# Altium footprint library ICL_passives_v1.PcbLib: 102 footprints (part 6 of 7)
Each footprint in its own frame and in the unit in brackets; x right, y up, seen from the top. Pads: shape width x height; smd on the part's side, far side on the other; paste and mask are expansions set on the pad; w line width, h text height; cw(c..) or ccw(c..) is an arc to the next point about the centre after c.
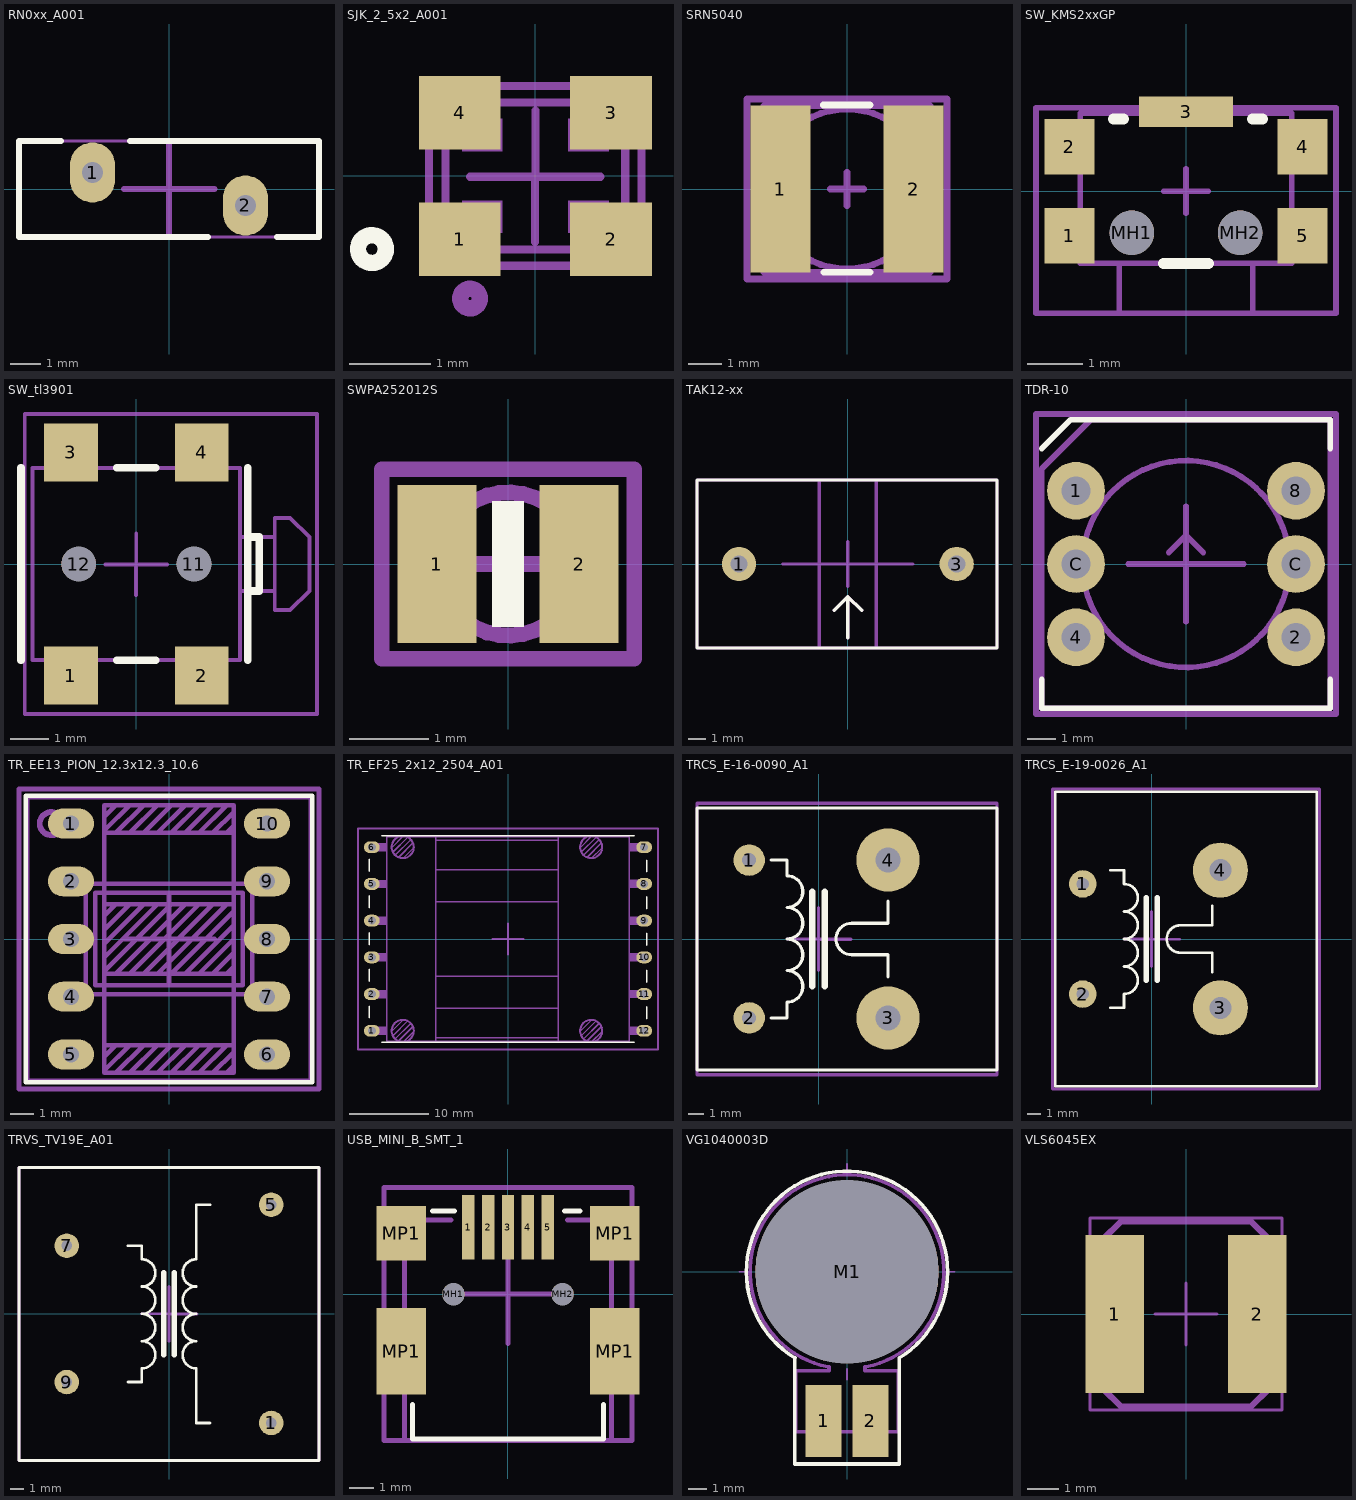
[diagram p5: the footprints below, top view; thin cyan lines are the x and y axes]

## RN0xx_A001 [mm] "fi 10mm L 14mm e 5.1mm"
pads (2):
  oval 1.5x2 hole 0.7 mask+0.1: 1(-2.55,0.55) 2(2.55,-0.55)
Top Overlay:
  lines w0.2: -3.6,1.6 -5,1.6 -5,-1.6 1.3,-1.6 ; -1.3,1.6 5,1.6 5,-1.6 3.6,-1.6
Top M17-18_TDES:
  text "'.Designator'" at -6.798,-3.9 h1.2
Top M19-20_TMOT:
  lines w0.1: -5,-1.6 -5,1.6 5,1.6 5,-1.6 -5,-1.6
Top M25-26_TORG:
  lines w0.2: -1.5,0 0,0 ; 0,-1.5 0,0 ; 0,1.5 0,0 ; 0.017,-0.005 1.517,-0.005
3D body "User Library-RXE020.STEP": height 11.79, standoff -2.9, extent -3.7,-1.5 3.7,1.5

## SJK_2_5x2_A001 [mm] "XTAL"
pads (4):
  rect 1x0.9 smd: 1(-0.925,-0.775) 2(0.925,-0.775) 3(0.925,0.775) 4(-0.925,0.775)
Top Overlay:
  circle w0.2: c-2,-0.895 r0.17
Top M11-12_SMOT:
  circle w0.2: c-0.8,-1.5 r0.12
  rectangle: -0.9,-0.7 -0.4,-0.3
  rectangle: 0.4,-0.7 0.9,-0.3
  rectangle: 0.4,0.3 0.9,0.7
  rectangle: -0.9,0.3 -0.4,0.7
  lines w0.1: -1.3,-0.9 cw(c-1.3,-1.1) -1.1,-1.1 1.1,-1.1 cw(c1.3,-1.1) 1.3,-0.9 1.3,0.9 cw(c1.3,1.1) 1.1,1.1 -1.1,1.1 cw(c-1.3,1.1) -1.3,0.9 -1.3,-0.9 ; -1.1,-0.7 ccw(c-0.9,-0.7) -0.9,-0.9 0.9,-0.9 ccw(c0.9,-0.7) 1.1,-0.7 1.1,0.7 ccw(c0.9,0.7) 0.9,0.9 0,0.9 -0.9,0.9 ccw(c-0.9,0.7) -1.1,0.7 -1.1,-0.7
Top M13-14_SDES:
  text "'.Designator'" at -3.399,1.75 h0.6
Top M15-16_SORG:
  lines w0.1: -0.802,-0.009 -0.002,-0.009 ; -0.005,-0.809 -0.005,-0.009 0.795,-0.009 ; 0,0 0,0.8 ; -1.3,-1.1 -1.3,1.1 1.3,1.1 1.3,-1.1 -1.3,-1.1
3D body: height 0.4, standoff 0, extent -1.3,-1.1 1.3,1.1
3D body: height 0.6, standoff 0.4, extent -1.209,-1.014 1.231,1.017

## SRN5040 [mm] "BOURNS  SRN5040"
pads (2):
  rect 1.8x5 smd mask+0: 1(-2,0) 2(2,0)
Top Overlay:
  lines w0.2: -0.71,2.52 0.69,2.52 ; -0.7,-2.5 0.7,-2.5
Top M11-12_SMOT:
  circle w0.2: c0,0 r2.4
  rectangle: 2.5,-2.1 2.8,2.1
  region: -2.506,2.123 -2.8,2.123 -2.8,-2.077 -2.506,-2.077
  lines w0.2: -2.5,-2.5 2.5,-2.5 2.5,2.5 -2.5,2.5 -2.5,-2.5
Top M13-14_SDES:
  text "'.Designator'" at -4.532,-0.333 h0.8
Top M15-16_SORG:
  lines w0.2: -0.5,0 0.5,0 ; 0,-0.5 0,0.5 ; -3,-2.7 -3,2.7 3,2.7 3,-2.7 -3,-2.7
3D body "SRN5040_v3.STEP": height 4.01, standoff 0.01, extent -2.5,-2.5 2.5,2.5

## SW_KMS2xxGP [mm] "smd side SW"
height 0.37
pads (7):
  rect 0.9x1 smd: 1(-2.1,-0.8) 2(-2.1,0.8) 4(2.1,0.8) 5(2.1,-0.8)
  rect 1.7x0.55 smd: 3(0,1.425)
  round 0.8 hole 0.8 unplated: MH1(-0.975,-0.75) MH2(0.975,-0.75)
Top Overlay:
  lines w0.2: -1.3,1.3 -1.125,1.3 ; -0.4,-1.3 0.4,-1.3 ; 1.2,1.3 1.375,1.3
Top M11-12_SMOT:
  region: -1.8,-0.4 -2.4,-0.4 -2.4,-1.2 -1.8,-1.2
  region: -1.8,1.2 -2.4,1.2 -2.4,0.4 -1.8,0.4
  rectangle: 1.8,-1.2 2.4,-0.4
  rectangle: 1.8,0.4 2.4,1.2
  lines w0.1: -1.2,-1.3 -1.2,-2.2 1.2,-2.2 1.2,-1.3 ; -1.9,-1.3 -1.9,1.4 1.9,1.4 1.9,-1.3 -1.9,-1.3
Top M13-14_SDES:
  text "'.Designator'" at -2.266,-0.167 h0.4
Top M15-16_SORG:
  lines w0.1: -0.4,0 0.4,0 ; 0,-0.4 0,0.4 ; -2.7,-2.2 -2.7,1.5 2.7,1.5 2.7,-2.2 -2.7,-2.2
3D body "KMS221GPLFS_col.stp": height 1.43, standoff -0.49, extent -2.3,-2.15 2.3,1.4

## SW_tl3901 [mm] "switch angle SMD"
pads (6):
  rect 1.4x1.5 smd: 1(-1.7,-2.9) 2(1.7,-2.9) 3(-1.7,2.9) 4(1.7,2.9)
  round 0.9 hole 0.9 unplated: 11(1.5,0) 12(-1.5,0)
Top Overlay:
  lines w0.2: -3,-2.5 -3,2.5 ; -0.5,-2.5 0.5,-2.5 ; -0.5,2.5 0.5,2.5 ; 2.9,-2.5 2.9,2.5 ; 2.9,-0.7 3.2,-0.7 3.2,0.7 2.9,0.7
Top M11-12_SMOT:
  rectangle: -2.3,2.2 -1.1,3.6
  rectangle: 1.1,2.2 2.3,3.6
  rectangle: 1.1,-3.6 2.3,-2.2
  rectangle: -2.3,-3.6 -1.1,-2.2
  lines w0.1: 2.7,-0.7 3.6,-0.7 ; 2.7,0.7 3.6,0.7 ; -2.7,-2.5 2.7,-2.5 2.7,2.5 -2.7,2.5 -2.7,-2.5 ; 3.6,-1.2 3.6,1.2 4,1.2 4.5,0.7 4.5,-0.7 4,-1.2 3.6,-1.2
Top M13-14_SDES:
  text "'.Designator'" at -3.399,1.15 h0.6
Top M15-16_SORG:
  lines w0.1: -0.802,-0.009 -0.002,-0.009 ; -0.005,-0.809 -0.005,-0.009 0.795,-0.009 ; 0,0 0,0.8 ; -2.9,-3.9 4.7,-3.9 4.7,3.9 -2.9,3.9 -2.9,-3.9
3D body "tl3901.stp": height 1.91, standoff -0.49, extent -2.7,-3 4.55,3

## SWPA252012S [mm]
pads (2):
  rect 1x2 smd mask+0: 1(-0.9,0) 2(0.9,0)
Top Overlay:
  rectangle: -0.2,-0.8 0.2,0.8
Top M11-12_SMOT:
  circle w0.2: c0,0 r0.906
  lines w0.2: -0.5,-0.8 -0.9,-0.8 -0.9,0.8 -0.5,0.8 ; 0.5,-0.8 0.906,-0.8 0.906,0.8 0.5,0.8
Top M13-14_SDES:
  text "'.Designator'" at -4.532,1.667 h0.8
Top M15-16_SORG:
  lines w0.2: -0.5,0 0.5,0 ; 0,-0.5 0,0.5 ; -1.6,-1.2 -1.6,1.2 1.6,1.2 1.6,-1.2 -1.6,-1.2
3D body "SWPA252012S.stp": height 1.02, standoff 0.01, extent -1.3,-1.1 1.3,1.1

## TAK12-xx [mm]
pads (2):
  round 2 hole 1: 1(-6.35,0) 3(6.35,0)
Top Overlay:
  lines w0.2: -0.8,-2.7 0,-1.9 ; 0,-4.3 0,-1.9 ; 0.8,-2.7 0,-1.9 ; -8.8,-4.9 -8.8,4.9 8.7,4.9 8.7,-4.9 -8.8,-4.9
Top M17-18_TDES:
  text "'.Designator'" at -5.765,2.583 h1
Top M19-20_TMOT:
  lines w0.2: -1.663,-4.9 -1.663,4.9 ; -0.8,-2.7 0,-1.9 ; 0,-4.3 0,-1.9 ; 0.8,-2.7 0,-1.9 ; 1.663,-4.9 1.663,4.9 ; -8.8,-4.9 8.7,-4.9 8.7,4.9 -8.8,4.9 -8.8,-4.9
Top M25-26_TORG:
  lines w0.2: -3.8,0 0,0 ; 0,-1.3 0,0 ; 0,1.3 0,0 ; 3.8,0 0,0
3D body "TAK12_A001.stp": height 21.21, standoff -4.19, extent -8.6,-4.75 8.6,4.75

## TDR-10 [mm] "rotary dip switch"
pads (6):
  round 2 hole 1 paste+0 mask+0.05: 1(-3.81,2.54) 2(3.81,-2.54) 4(-3.81,-2.54) 8(3.81,2.54) C(-3.81,0) C(3.81,0)
Top Overlay:
  lines w0.2: -5,-4 -5,-5 5,-5 5,-4 ; -5,4 -4,5 5,5 5,4
Top M17-18_TDES:
  text "'.Designator'" at 0.417,-5.665 h1
Top M19-20_TMOT:
  circle w0.2: c0,0 r3.585
  lines w0.2: 0,-0.9 0,1 ; 0.6,0.4 0,1 ; -0.6,0.4 -0.6,0.4 ; -0.6,0.4 0,1 ; -5,-5 -5,3.3 -3.3,5 5,5 5,-5 -5,-5
  text "9" at -1.561,1.28 h1.2
  text "8" at -1.953,0.034 h1.2
  text "7" at -1.706,-0.795 h1.2
  text "6" at -0.824,-1.75 h1.2
  text "5" at 0.4,-1.9 h1.2
  text "4" at 1.471,-1.28 h1.2
  text "3" at 1.853,-0.334 h1.2
  text "2" at 1.706,1.095 h1.2
  text "1" at 0.886,1.732 h1.2
  text "0" at 0.3,3.1 h1.2
Top M25-26_TORG:
  lines w0.2: -2,0 0,0 ; 0,-2 0,0 ; 0,2 0,0 ; 2,0 0,0 ; -5.2,-5.2 -5.2,5.2 5.2,5.2 5.2,-5.2 -5.2,-5.2
3D body "TDR-10.STEP": height 6.61, standoff -3.79, extent -5,-5 5,5

## TR_EE13_PION_12.3x12.3_10.6 [mm]
pads (10):
  oval 2x1.3 hole 0.7: 1(-4.25,5) 2(-4.25,2.5) 3(-4.25,0) 4(-4.25,-2.5) 5(-4.25,-5) 6(4.25,-5) 7(4.25,-2.5) 8(4.25,0) 9(4.25,2.5) 10(4.25,5)
Top Overlay:
  lines w0.2: -6.2,-6.2 -6.2,5.8 -6.2,6.2 6.2,6.2 6.2,-6.2 -6.2,-6.2
Top M17-18_TDES:
  text "'.Designator'" at -0.583,7.931 h1.4
Top M19-20_TMOT:
  circle w0.254: c-5.1,5 r0.5
  lines w0.2: -2.8,-5.7 -1.7,-4.6 ; -2.8,-5.1 -2.3,-4.6 ; -2.8,-4.6 2.8,-4.6 ; -2.8,-1.5 2.8,-1.5 ; -2.8,-1.4 0.1,1.5 ; -2.8,-0.8 -0.5,1.5 ; -2.8,-0.2 -1.1,1.5 ; -2.8,0.4 -1.7,1.5 ; -2.8,1 -2.3,1.5 ; -2.8,1.5 2.8,1.5 ; -2.8,4.6 2.8,4.6 ; -2.8,4.7 -1.7,5.8 ; -2.8,5.3 -2.3,5.8 ; -2.3,-5.8 -1.1,-4.6 ; -2.3,-1.5 0.7,1.5 ; -2.3,4.6 -1.1,5.8 ; -1.7,-5.8 -0.5,-4.6 ; -1.7,-1.5 1.3,1.5 ; -1.7,4.6 -0.5,5.8 ; -1.1,-5.8 0.1,-4.6 ; -1.1,-1.5 1.9,1.5 ; -1.1,4.6 0.1,5.8 ; -0.6,-1.5 -0.5,-1.5 2.5,1.5 ; -0.5,-5.8 0.7,-4.6 ; -0.5,4.6 0.7,5.8 ; 0.1,-5.8 1.3,-4.6 ; 0.1,-1.5 2.8,1.2 ; 0.1,4.6 1.3,5.8 ; 0.7,-5.8 1.9,-4.6 ; 0.7,-1.5 2.8,0.6 ; 0.7,4.6 1.9,5.8 ; 1.3,-5.8 2.5,-4.6 ; 1.3,-1.5 2.8,0 ; 1.3,4.6 2.5,5.8 ; 1.9,-5.8 2.8,-4.9 ; 1.9,-1.5 2.8,-0.6 ; 1.9,4.6 2.8,5.5 ; 2.5,-5.8 2.8,-5.5 ; 2.5,-1.5 2.8,-1.2 ; 2.5,4.6 2.8,4.9 ; -6.15,-6.15 -6.15,6.15 6.15,6.15 6.15,-6.15 -6.15,-6.15 ; -3.6,-2.4 -3.6,2.4 3.6,2.4 3.6,-2.4 -3.6,-2.4 ; -3.2,-2 3.2,-2 3.2,2 -3.2,2 -3.2,-2 ; -2.8,-5.8 -2.8,5.8 2.8,5.8 2.8,-5.8 -2.8,-5.8
Top M25-26_TORG:
  lines w0.2: -1.97,0 0,0 ; 0,-1.97 0,0 ; 0,1.97 0,0 ; 1.97,0 0,0 ; -6.5,-6.5 6.5,-6.5 6.5,6.5 -6.5,6.5 -6.5,-6.5
3D body "EE13-K-V-10P-SS_zêo+enie.STEP": height 12.1, standoff -4.75, extent -6.15,-6.5 6.15,6.5

## TR_EF25_2x12_2504_A01 [mm]
pads (12):
  oval 2x1.5 hole 1: 1(-17.25,-11.625) 2(-17.25,-6.975) 3(-17.25,-2.325) 4(-17.25,2.325) 5(-17.25,6.975) 6(-17.25,11.625) 7(17.25,11.625) 8(17.25,6.975) 9(17.25,2.325) 10(17.25,-2.325) 11(17.25,-6.975) 12(17.25,-11.625)
Top Overlay:
  lines w0.2: -17.6,-10 -17.6,-8.5 ; -17.6,-5.35 -17.6,-3.85 ; -17.6,-0.7 -17.6,0.8 ; -17.6,3.95 -17.6,5.45 ; -17.6,8.6 -17.6,10.1 ; -16,-13.1 16,-13.1 ; -16,13.1 16,13.1 ; 17.6,-10.1 17.6,-8.6 ; 17.6,-5.45 17.6,-3.95 ; 17.6,-0.8 17.6,0.7 ; 17.6,3.85 17.6,5.35 ; 17.6,8.5 17.6,10
Top M19-20_TMOT:
  circle w0.254: c-13.336,-11.633 r1.4
  circle w0.254: c-13.336,11.633 r1.4
  circle w0.254: c10.536,-11.633 r1.4
  circle w0.254: c10.536,11.633 r1.4
  region: -15.35,-11.1 -17.25,-11.1 -17.25,-12.155 -15.35,-12.155
  region: -15.35,-6.45 -17.25,-6.45 -17.25,-7.505 -15.35,-7.505
  region: -15.35,-1.8 -17.25,-1.8 -17.25,-2.855 -15.35,-2.855
  region: -15.35,2.85 -17.25,2.85 -17.25,1.795 -15.35,1.795
  region: -15.35,7.5 -17.25,7.5 -17.25,6.445 -15.35,6.445
  region: -15.35,12.15 -17.25,12.15 -17.25,11.095 -15.35,11.095
  rectangle: 15.35,-12.15 17.25,-11.095
  rectangle: 15.35,-7.5 17.25,-6.445
  rectangle: 15.35,-2.85 17.25,-1.795
  rectangle: 15.35,1.8 17.25,2.855
  rectangle: 15.35,6.45 17.25,7.505
  rectangle: 15.35,11.1 17.25,12.155
  lines w0.2: -14.7,-11.666 -13.35,-10.316 ; -14.7,11.6 -13.35,12.95 -13.336,12.95 ; -14.547,-12.221 -12.735,-10.401 ; -14.547,11.046 -12.735,12.865 ; -14.3,-12.666 -12.3,-10.666 ; -14.3,10.6 -12.3,12.6 ; -13.835,-12.901 -12.05,-11.116 ; -13.835,10.365 -12.05,12.15 -12.035,12.15 ; -13.25,-13.016 -11.972,-11.738 ; -13.25,10.25 -11.972,11.528 -11.972,11.597 -11.936,11.633 ; -9.15,-12.95 -9.15,-4.7 ; -9.15,-12.5 6.35,-12.5 ; -9.15,-8.75 6.35,-8.75 ; -9.15,8.7 -9.15,9 ; -9.15,8.75 6.35,8.75 ; -9.15,12.5 6.35,12.5 ; -9.15,12.95 -9.15,4.7 ; 6.35,-12.95 6.35,-4.7 ; 6.35,12.95 6.35,4.7 ; 9.171,-11.666 10.521,-10.316 ; 9.171,11.6 10.521,12.95 ; 9.325,-12.221 11.136,-10.401 ; 9.325,11.046 11.136,12.865 ; 9.571,-12.666 11.571,-10.666 ; 9.571,10.6 11.571,12.6 ; 10.037,-12.901 11.821,-11.116 ; 10.037,10.365 11.821,12.15 ; 10.621,-13.016 11.9,-11.738 ; 10.621,10.25 11.9,11.528 ; -12.3,12.6 -12.3,12.6 ; -11.936,11.633 -11.936,11.633 ; -9.15,-4.7 6.35,-4.7 ; -9.15,-4.7 -9.15,4.7 ; -9.15,4.7 6.35,4.7 ; 6.35,-4.7 6.35,4.7 ; -15.35,-12.95 15.35,-12.95 15.35,12.95 -15.35,12.95 -15.35,-12.95
Top M25-26_TORG:
  lines w0.2: -2,0 0,0 ; 0,-2 0,0 ; 0,2 0,0 ; 2,0 0,0 ; -19,-14 -19,14 19,14 19,-14 -19,-14
3D body "EF25_7-K-H-12P-632-zêo+enie.STEP": height 17.41, standoff -2.99, extent -17.57,-12.95 17.57,12.95

## TRCS_E-16-0090_A1 [mm] "current transformer"
pads (4):
  round 2 hole 0.9 mask+0.1: 1(-4.4,5) 2(-4.4,-5)
  round 4 hole 1.6 mask+0.1: 3(4.4,-5) 4(4.4,5)
Top Overlay:
  lines w0.2: -3,-5 -2.004,-5 -2.004,-4 ; -3,5 -2,5 -2,4 cw(c-2,3) -2,2 cw(c-2,1) -2,0 cw(c-2,-1) -2,-2 cw(c-2,-3) -2,-4 ; 4.4,-2.4 4.4,-1 2.1,-1 cw(c2.1,0) 2.1,1 4.4,1 4.4,2.4 ; -7.7,-8.3 -7.7,8.3 11.3,8.3 11.3,-8.3 -7.7,-8.3
  lines w0.4: -0.4,-3 -0.4,3 ; 0.4,-3 0.4,3
Top M17-18_TDES:
  text "'.Designator'" at -10.33,-0.833 h2
Top M19-20_TMOT:
  lines w0.1: -7.7,-8.3 -7.7,8.3 11.3,8.3 11.3,-8.3 -7.7,-8.3
Top M25-26_TORG:
  lines w0.2: -2,0 0,0 ; 0,-2 0,0 ; 0,2 0,0 ; 0.045,-0.013 2.045,-0.013 ; -7.7,-8.6 -7.7,8.6 11.3,8.6 11.3,-8.6 -7.7,-8.6
3D body "784363swp001.stp": height 19.2, standoff -4.5, extent -7.7,-8.25 11.3,8.25

## TRCS_E-19-0026_A1 [mm] "current transformer"
pads (4):
  round 2 hole 0.9 mask+0.1: 1(-5,4) 2(-5,-4)
  round 4 hole 1.6 mask+0.1: 3(5,-5) 4(5,5)
Top Overlay:
  lines w0.2: -3,-5 -2.004,-5 -2.004,-4 ; -3,5 -2,5 -2,4 cw(c-2,3) -2,2 cw(c-2,1) -2,0 cw(c-2,-1) -2,-2 cw(c-2,-3) -2,-4 ; 4.4,-2.4 4.4,-1 2.1,-1 cw(c2.1,0) 2.1,1 4.4,1 4.4,2.4 ; -7,-10.7 12,-10.7 12,10.7 -7,10.7 -7,-10.7
  lines w0.4: -0.4,-3 -0.4,3 ; 0.4,-3 0.4,3
Top M17-18_TDES:
  text "'.Designator'" at -10.33,-0.833 h2
Top M19-20_TMOT:
  lines w0.1: -7,-10.7 12,-10.7 12,10.7 -7,10.7 -7,-10.7
Top M25-26_TORG:
  lines w0.2: -2,0 0,0 ; 0,-2 0,0 ; 0,2 0,0 ; 0.045,-0.013 2.045,-0.013 ; -7.2,-10.9 -7.2,10.9 12.2,10.9 12.2,-10.9 -7.2,-10.9
3D body "784499swp001.stp": height 19, standoff -4.7, extent -7,-10.75 12,10.75

## TRVS_TV19E_A01 [mm] "currend type  voltage transformer"
pads (4):
  round 1.8 hole 0.8 mask+0.1: 1(7.5,-8) 5(7.5,8) 7(-7.5,5) 9(-7.5,-5)
Top Overlay:
  lines w0.2: -3,-5 -2.004,-5 -2.004,-4 ; -3,5 -2,5 -2,4 cw(c-2,3) -2,2 cw(c-2,1) -2,0 cw(c-2,-1) -2,-2 cw(c-2,-3) -2,-4 ; 2,4 ccw(c2,3) 2,2 ccw(c2,1) 2,0 ccw(c2,-1) 2,-2 ccw(c2,-3) 2,-4 2,-8 3,-8 ; 2.004,4 2.004,8 3,8 ; -11,-10.75 11,-10.75 11,10.732 -11,10.732 -11,-10.75
  lines w0.4: -0.4,-3 -0.4,3 ; 0.4,-3 0.4,3
Top M17-18_TDES:
  text "'.Designator'" at -10.33,-0.833 h2
Top M19-20_TMOT:
  lines w0.1: -11,-10.75 11,-10.75 11,10.732 -11,10.732 -11,-10.75
Top M25-26_TORG:
  lines w0.2: -2,0 0,0 ; 0,-2 0,0 ; 0,2 0,0 ; 0.045,-0.013 2.045,-0.013 ; -11,-10.75 -11,10.732 11,10.732 11,-10.75 -11,-10.75
3D body "TV19E_2.stp": height 18.01, standoff -2.99, extent -11,-10.75 11,10.732

## USB_MINI_B_SMT_1 [mm]
pads (11):
  rect 0.5x2.6 smd: 1(-1.6,2.7) 2(-0.8,2.7) 3(0,2.7) 4(0.8,2.7) 5(1.6,2.7)
  round 0.9 hole 0.9 unplated: MH1(-2.2,0) MH2(2.2,0)
  rect 2x3.5 smd: MP1(-4.3,-2.3) MP1(4.3,-2.3)
  rect 2x2.2 smd: MP1(-4.3,2.45) MP1(4.3,2.45)
Top Overlay:
  lines w0.2: -3.85,-5.85 3.85,-5.85 ; -3.85,-5.842 -3.85,-4.445 ; -3.048,3.35 -2.159,3.35 ; 2.286,3.35 2.9,3.35 ; 3.85,-5.842 3.85,-4.445
Top M11-12_SMOT:
  rectangle: -1.8,1.7 -1.4,3.4
  rectangle: -1,1.7 -0.6,3.4
  rectangle: 0.6,1.7 1,3.4
  rectangle: 1.4,1.7 1.8,3.4
  rectangle: -0.2,1.7 0.2,3.4
  lines w0.2: -4.2,-3.3 -5,-3.3 -5,-1.2 -4.2,-1.2 ; -2.3,3 -4.181,3 ; 2.4,3 4.181,3 ; -4.181,1.9 -4.981,1.9 -4.981,3 -4.181,3 ; -4.181,1.9 -4.181,3 ; -4.181,1.9 -4.181,-1.2 -4.181,-3.3 -4.181,-5.9 4.181,-5.9 4.181,-3.3 ; 4.181,-3.3 4.981,-3.3 4.981,-1.2 4.181,-1.2 ; 4.181,-3.3 4.181,-1.2 ; 4.181,-1.2 4.181,1.9 ; 4.181,1.9 4.981,1.9 4.981,3 4.181,3 ; 4.181,1.9 4.181,3
Top M13-14_SDES:
  text "'.Designator'" at -6.798,-2.4 h1.2
Top M15-16_SORG:
  lines w0.2: -2,0 0,0 ; 0,-2 0,0 ; 0,2 0,0 ; 2,0 0,0 ; -5,-5.9 5,-5.9 5,4.3 2.8,4.3 -5,4.3 -5,-5.9
3D body "10033526-n3212mlfc_AMPHENOL_USB.STEP": height 3.96, standoff -0.94, extent -4.95,-5.9 4.95,3.425
3D body "675031020_usb.STEP": height 3.96, standoff -0.99, extent -4.95,-5.9 4.95,3.1

## VG1040003D [mm] "vibration motor"
pads (3):
  rect 2x4 smd: 1(-1.3,-8.3) 2(1.3,-8.3)
  round 10.2 hole 10.2 unplated: M1(0,0)
Top Overlay:
  lines w0.2: -2.9,-4.793 -2.9,-10.7 2.9,-10.7 2.9,-4.791 ccw(c0,0) -2.896,-4.793
Top M11-12_SMOT:
  rectangle: -2.25,-8.4 -0.35,-6.4
  rectangle: 0.35,-8.4 2.25,-6.4
  lines w0.2: -1.059,-5.295 cw(c0,0) 1.059,-5.295 ; -1,-5.295 -1,-5.5 -2.85,-5.5 -2.85,-8.9 2.85,-8.9 2.85,-5.5 1,-5.5 1,-5.295
Top M13-14_SDES:
  text "'.Designator'" at -6.4,-8.998 h1.2
Top M15-16_SORG:
  lines w0.1: -6,0 -5.4,0 ; 0,-6 0,-5.4 ; 0,5.4 0,6 ; 5.4,0 6,0
3D body "VG1040003D.stp": height 0.67, standoff -3.38, extent -5,-8.9 4.998,4.998

## VLS6045EX [mm]
pads (2):
  rect 1.9x5.1 smd: 1(-2.3,0) 2(2.3,0)
Top M11-12_SMOT:
  region: -2.1,2.2 -3,2.2 -3,-2.2 -2.1,-2.2
  rectangle: 2.1,-2.2 3,2.2
  lines w0.2: -3,-2.4 -3,2.4 -2.7,2.4 -2.1,3 2.1,3 2.7,2.4 3,2.4 3,-2.4 2.7,-2.4 2.1,-3 -2.1,-3 -2.7,-2.4 -3,-2.4
Top M13-14_SDES:
  text "'.Designator'" at -4.532,-0.333 h0.8
Top M15-16_SORG:
  lines w0.1: -1,0 1,0 ; 0,-1 0,1 ; -3.1,-3.1 -3.1,3.1 3.1,3.1 3.1,-3.1 -3.1,-3.1
3D body: height 1, standoff 0, extent -3,-3 3,3
3D body: height 3.5, standoff 1, extent -3,-3 3,3
3D body: height 4.5, standoff 3.5, extent -3,-3 3,3
3D body: height 1, standoff 0, extent 2.7,-2.2 3,2.2
3D body: height 1, standoff 0, extent -3,-2.2 -2.7,2.2